# Altium footprint library PCB-Tester-Board-V1.PcbLib: 48 footprints (part 2 of 3)
Each footprint in its own frame and in the unit in brackets; x right, y up, seen from the top. Pads: shape width x height; smd on the part's side, far side on the other; paste and mask are expansions set on the pad; w line width, h text height; cw(c..) or ccw(c..) is an arc to the next point about the centre after c.
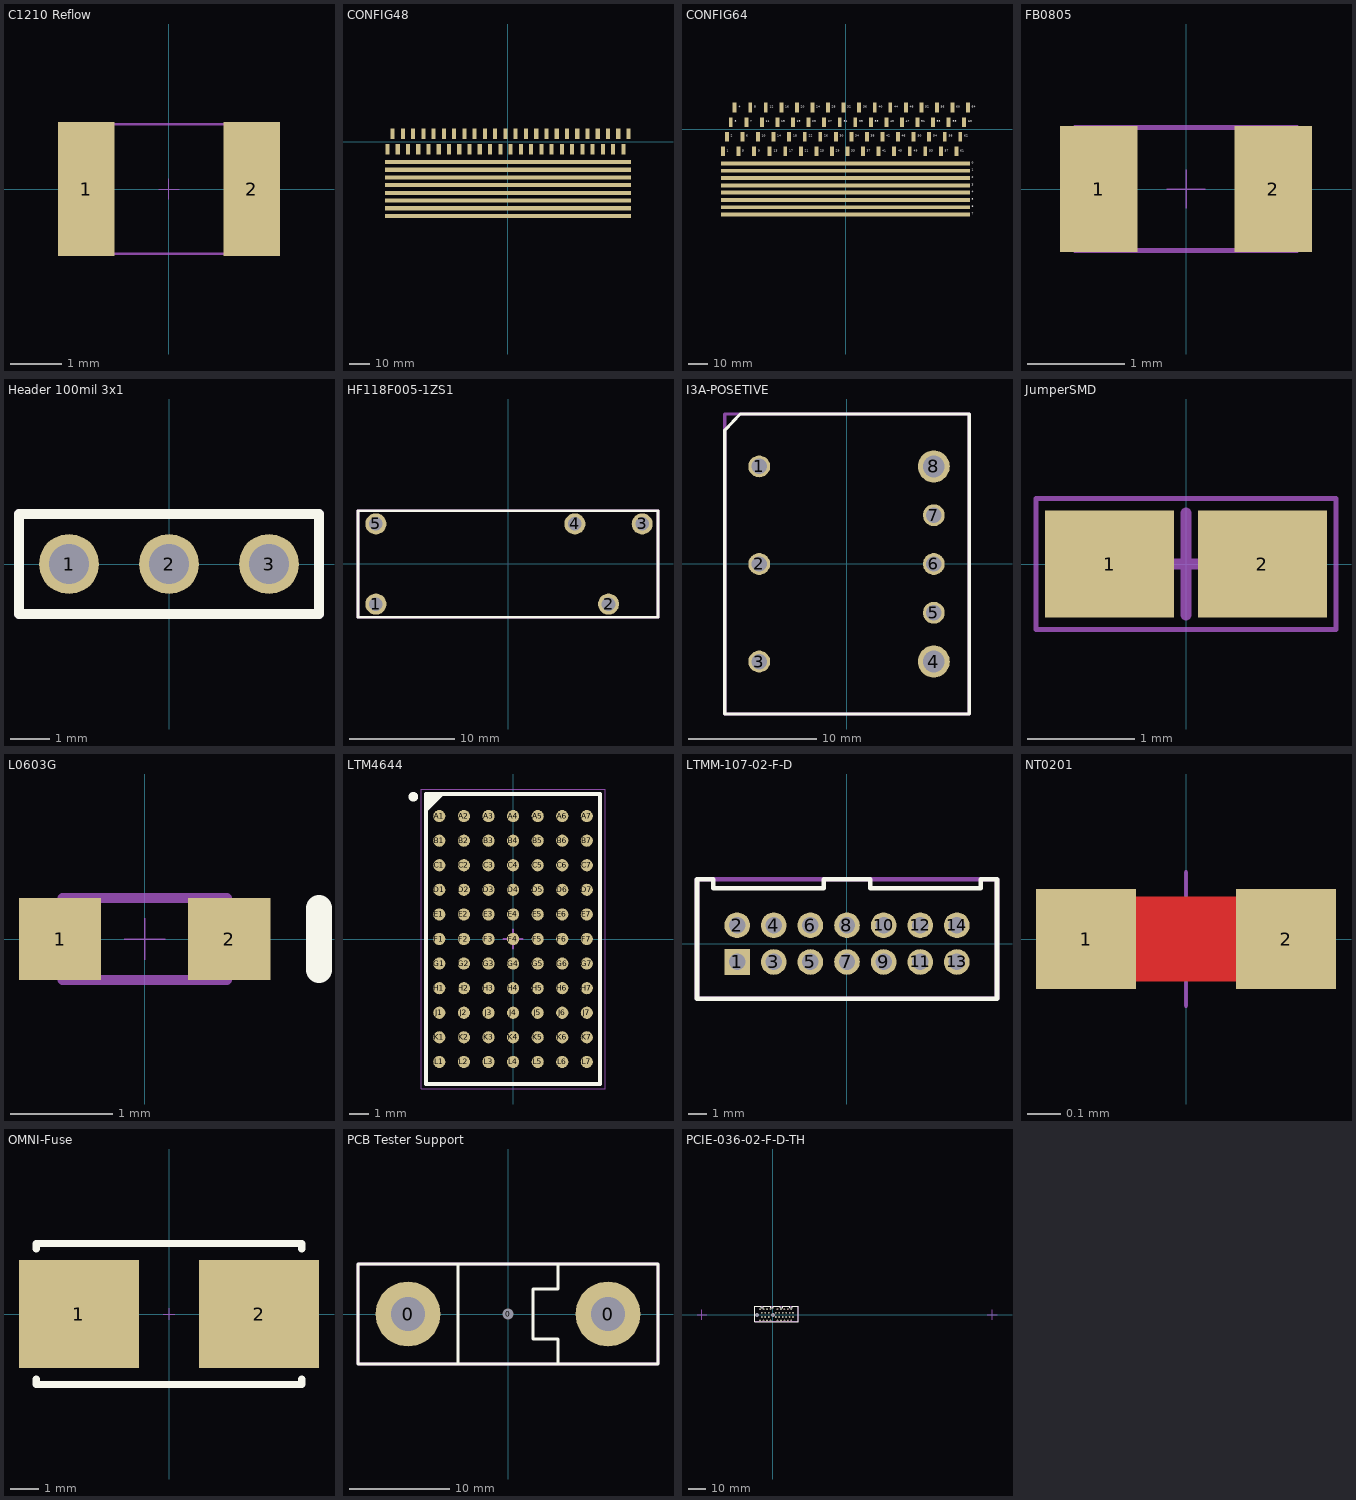
[diagram p1: the footprints below, top view; thin cyan lines are the x and y axes]

## C1210 Reflow [mm] "SMT Capacitor 1210 Reflow Soldering"
pads (2):
  rect 1.1x2.6 smd: 1(-1.6,0) 2(1.6,0)
Top Courtyard:
  lines w0.05: -1.6,-1.25 1.6,-1.25 1.6,1.25 -1.6,1.25 -1.6,-1.25
Mechanical 17:
  lines w0.013: -0.2,0 0.2,0 ; 0,-0.2 0,0.2
3D body "C1210.STEP": height 0.78, standoff 0, extent -1.6,-1.25 1.6,1.25

## CONFIG48 [mm] "PCB Tester Configuration area (48 relays)"
pads (56):
  rect 2x5 smd: 1(-58.75,-3.75) 2(-56.25,3.75) 3(-53.75,-3.75) 4(-51.25,3.75) 5(-48.75,-3.75) 6(-46.25,3.75) 7(-43.75,-3.75) 8(-41.25,3.75) 9(-38.75,-3.75) 10(-36.25,3.75) 11(-33.75,-3.75) 12(-31.25,3.75) 13(-28.75,-3.75) 14(-26.25,3.75) 15(-23.75,-3.75) 16(-21.25,3.75) 17(-18.75,-3.75) 18(-16.25,3.75) 19(-13.75,-3.75) 20(-11.25,3.75) 21(-8.75,-3.75) 22(-6.25,3.75) 23(-3.75,-3.75) 24(-1.25,3.75) 25(1.25,-3.75) 26(3.75,3.75) 27(6.25,-3.75) 28(8.75,3.75) 29(11.25,-3.75) 30(13.75,3.75) 31(16.25,-3.75) 32(18.75,3.75) 33(21.25,-3.75) 34(23.75,3.75) 35(26.25,-3.75) 36(28.75,3.75) 37(31.25,-3.75) 38(33.75,3.75) 39(36.25,-3.75) 40(38.75,3.75) 41(41.25,-3.75) 42(43.75,3.75) 43(46.25,-3.75) 44(48.75,3.75) 45(51.25,-3.75) 46(53.75,3.75) 47(56.25,-3.75) 48(58.75,3.75)
  rect 120x2 smd paste-100: ABUS0(0,-10) ABUS1(0,-13.75) ABUS2(0,-17.5) ABUS3(0,-21.25) ABUS4(0,-25) ABUS5(0,-28.75) ABUS6(0,-32.5) ABUS7(0,-36.25)

## CONFIG64 [mm] "PCB Tester Configuration area (64 relays)"
pads (72):
  rect 2x5 smd: 1(-63,-11.25) 2(-61,-3.75) 3(-59,3.75) 4(-57,11.25) 5(-55,-11.25) 6(-53,-3.75) 7(-51,3.75) 8(-49,11.25) 9(-47,-11.25) 10(-45,-3.75) 11(-43,3.75) 12(-41,11.25) 13(-39,-11.25) 14(-37,-3.75) 15(-35,3.75) 16(-33,11.25) 17(-31,-11.25) 18(-29,-3.75) 19(-27,3.75) 20(-25,11.25) 21(-23,-11.25) 22(-21,-3.75) 23(-19,3.75) 24(-17,11.25) 25(-15,-11.25) 26(-13,-3.75) 27(-11,3.75) 28(-9,11.25) 29(-7,-11.25) 30(-5,-3.75) 31(-3,3.75) 32(-1,11.25) 33(1,-11.25) 34(3,-3.75) 35(5,3.75) 36(7,11.25) 37(9,-11.25) 38(11,-3.75) 39(13,3.75) 40(15,11.25) 41(17,-11.25) 42(19,-3.75) 43(21,3.75) 44(23,11.25) 45(25,-11.25) 46(27,-3.75) 47(29,3.75) 48(31,11.25) 49(33,-11.25) 50(35,-3.75) 51(37,3.75) 52(39,11.25) 53(41,-11.25) 54(43,-3.75) 55(45,3.75) 56(47,11.25) 57(49,-11.25) 58(51,-3.75) 59(53,3.75) 60(55,11.25) 61(57,-11.25) 62(59,-3.75) 63(61,3.75) 64(63,11.25)
  rect 128x2 smd paste-100: ABUS0(0,-17.5) ABUS1(0,-21.25) ABUS2(0,-25) ABUS3(0,-28.75) ABUS4(0,-32.5) ABUS5(0,-36.25) ABUS6(0,-40) ABUS7(0,-43.75)
Top Overlay:
  text "4" at -55,10.616 h2
  text "3" at -57,3.125 h2
  text "2" at -59,-4.381 h2
  text "1" at -61.005,-11.882 h2
  text "0" at 65,-18.124 h2
  text "1" at 65,-21.884 h2
  text "2" at 65,-25.608 h2
  text "3" at 65,-29.367 h2
  text "4" at 65,-33.11 h2
  text "5" at 65,-36.887 h2
  text "6" at 65,-40.647 h2
  text "7" at 65,-44.371 h2
  text "5" at -53.004,-11.883 h2
  text "6" at -51,-4.382 h2
  text "7" at -49,3.125 h2
  text "8" at -47,10.616 h2
  text "9" at -45.004,-11.883 h2
  text "10" at -43,-4.382 h2
  text "11" at -41,3.125 h2
  text "12" at -39,10.616 h2
  text "13" at -37.004,-11.883 h2
  text "14" at -35,-4.382 h2
  text "15" at -33,3.125 h2
  text "16" at -31,10.616 h2
  text "17" at -29.004,-11.883 h2
  text "18" at -27,-4.382 h2
  text "19" at -25,3.125 h2
  text "20" at -23,10.616 h2
  text "21" at -21.004,-11.883 h2
  text "22" at -19,-4.382 h2
  text "23" at -17,3.125 h2
  text "24" at -15,10.616 h2
  text "25" at -13.004,-11.883 h2
  text "26" at -11,-4.382 h2
  text "27" at -9,3.125 h2
  text "28" at -7,10.616 h2
  text "29" at -5.004,-11.883 h2
  text "30" at -3,-4.382 h2
  text "31" at -1,3.125 h2
  text "32" at 1,10.616 h2
  text "33" at 2.996,-11.883 h2
  text "34" at 5,-4.382 h2
  text "35" at 7,3.125 h2
  text "36" at 9,10.616 h2
  text "37" at 10.996,-11.883 h2
  text "38" at 13,-4.382 h2
  text "39" at 15,3.125 h2
  text "40" at 17,10.616 h2
  text "41" at 18.996,-11.883 h2
  text "42" at 21,-4.382 h2
  text "43" at 23,3.125 h2
  text "44" at 25,10.616 h2
  text "45" at 26.996,-11.883 h2
  text "46" at 29,-4.382 h2
  text "47" at 31,3.125 h2
  text "48" at 33,10.616 h2
  text "49" at 34.996,-11.883 h2
  text "50" at 37,-4.382 h2
  text "51" at 39,3.125 h2
  text "52" at 41,10.616 h2
  text "53" at 42.996,-11.883 h2
  text "54" at 45,-4.382 h2
  text "55" at 47,3.125 h2
  text "56" at 49,10.616 h2
  text "57" at 50.996,-11.883 h2
  text "58" at 53,-4.382 h2
  text "59" at 55,3.125 h2
  text "60" at 57,10.616 h2
  text "61" at 58.996,-11.883 h2
  text "62" at 61,-4.382 h2
  text "63" at 63,3.125 h2
  text "64" at 65,10.616 h2

## FB0805 [mm] "SMT Ferrite Bead 0805"
pads (2):
  rect 0.8x1.3 smd: 1(-0.9,0) 2(0.9,0)
Top Courtyard:
  lines w0.05: -1.15,-0.635 -1.15,0.635 1.15,0.635 1.15,-0.635 -1.15,-0.635
Mechanical 17:
  lines w0.013: -0.2,0 0.2,0 ; 0,-0.2 0,0.2
3D body "MPZ2012.STEP": height 1.05, standoff 0, extent -1.15,-0.635 1.15,0.635

## Header 100mil 3x1 [mil] "HMTSW-103-07-G-S-240"
pads (3):
  round 60 hole 40: 1(-100,0) 2(0,0) 3(100,0)
Top Overlay:
  lines w10: -150,-50 150,-50 150,50 -150,50 -150,-50
  text "." at -102.76,-70.87 h39.37
Top Courtyard:
  lines w10: -150,-50 150,-50 150,50 -150,50 -150,-50
3D body "HMTSW-103-07-G-S-240.STEP": height 340, standoff -90, extent -149.99,-48.99 150.01,49

## HF118F005-1ZS1 [mm] "Power Relay (Switch Over)"
pads (5):
  round 2 hole 1.3 unplated paste-5: 1(-12.55,-3.81) 2(9.55,-3.81) 3(12.75,3.81) 4(6.35,3.81) 5(-12.55,3.81)
Top Overlay:
  lines w0.254: -14.25,-5.05 -14.25,5.05 14.25,5.05 14.25,-5.05 -14.25,-5.05
Top Courtyard:
  lines w0.254: -14.25,-5.05 -14.25,5.05 14.25,5.05 14.25,-5.05 -14.25,-5.05
3D body "HF118F005-1ZS1.STEP": height 12.2, standoff -3.7, extent -14.25,-5.05 14.25,5.05

## HSM2.5-6.4-16-2 [mm] "M2.5 x 16 mm hex standoff"
3D body "HSM2.5-6.4-16-2.STEP": height 16, standoff -6, extent -3.695,-3.2 3.695,3.2

## I3A-POSETIVE [mm]
pads (8):
  round 1.7 hole 1.2 paste+0: 1(-6.8,7.6) 2(-6.8,0) 3(-6.8,-7.6) 5(6.8,-3.8) 6(6.8,0) 7(6.8,3.8)
  round 2.5 hole 1.7 paste+0: 4(6.8,-7.6) 8(6.8,7.6)
Top Overlay:
  lines w0.254: -9.487,-11.684 9.563,-11.684 9.563,11.684 -8.293,11.684 -9.487,10.414 -9.487,-11.684
Top Courtyard:
  lines w0.254: 9.563,-11.684 -9.487,-11.684 -9.487,11.684 9.563,11.684 9.563,-11.684 ; 9.563,-11.684 9.563,-11.684
3D body "i3a.STEP": height 9.54, standoff -3.68, extent -9.487,-11.684 9.563,11.684

## JumperSMD [mm] "Chip Resistor, Body 1.6x0.8mm (LxW typ), IPC High Density"
height 10
pads (2):
  rect 1.2x1 smd: 1(-0.711,0) 2(0.711,0)
Top Courtyard:
  lines w0.05: -1.397,-0.61 1.397,-0.61 1.397,0.61 -1.397,0.61 -1.397,-0.61
Mechanical 17:
  lines w0.1: -0.475,0 0.475,0 ; 0,-0.475 0,0.475 0,-0.475
3D body "R0603.STEP": height 0.45, standoff 0, extent -0.889,-0.4 0.711,0.4

## L0603G [mm] "LTST-C191KGKT"
pads (2):
  rect 0.8x0.8 smd: 1(-0.825,0) 2(0.825,0)
Top Overlay:
  lines w0.254: 1.7,-0.3 1.7,0.3
Top Courtyard:
  lines w0.1: -0.8,-0.4 0.8,-0.4 0.8,0.4 -0.8,0.4 -0.8,-0.4
Mechanical 17:
  lines w0.013: -0.2,0 0.2,0 ; 0,-0.2 0,0.2
3D body "L0603G.STEP": height 0.8, standoff 0, extent -0.8,-0.4 0.8,0.4

## LTM4644 [mm]
height 5.21
pads (77):
  round 0.63 smd: A1(-3.81,6.35) A2(-2.54,6.35) A3(-1.27,6.35) A4(0,6.35) A5(1.27,6.35) A6(2.54,6.35) A7(3.81,6.35) B1(-3.81,5.08) B2(-2.54,5.08) B3(-1.27,5.08) B4(0,5.08) B5(1.27,5.08) B6(2.54,5.08) B7(3.81,5.08) C1(-3.81,3.81) C2(-2.54,3.81) C3(-1.27,3.81) C4(0,3.81) C5(1.27,3.81) C6(2.54,3.81) C7(3.81,3.81) D1(-3.81,2.54) D2(-2.54,2.54) D3(-1.27,2.54) D4(0,2.54) D5(1.27,2.54) D6(2.54,2.54) D7(3.81,2.54) E1(-3.81,1.27) E2(-2.54,1.27) E3(-1.27,1.27) E4(0,1.27) E5(1.27,1.27) E6(2.54,1.27) E7(3.81,1.27) F1(-3.81,0) F2(-2.54,0) F3(-1.27,0) F4(0,0) F5(1.27,0) F6(2.54,0) F7(3.81,0) G1(-3.81,-1.27) G2(-2.54,-1.27) G3(-1.27,-1.27) G4(0,-1.27) G5(1.27,-1.27) G6(2.54,-1.27) G7(3.81,-1.27) H1(-3.81,-2.54) H2(-2.54,-2.54) H3(-1.27,-2.54) H4(0,-2.54) H5(1.27,-2.54) H6(2.54,-2.54) H7(3.81,-2.54) J1(-3.81,-3.81) J2(-2.54,-3.81) J3(-1.27,-3.81) J4(0,-3.81) J5(1.27,-3.81) J6(2.54,-3.81) J7(3.81,-3.81) K1(-3.81,-5.08) K2(-2.54,-5.08) K3(-1.27,-5.08) K4(0,-5.08) K5(1.27,-5.08) K6(2.54,-5.08) K7(3.81,-5.08) L1(-3.81,-6.35) L2(-2.54,-6.35) L3(-1.27,-6.35) L4(0,-6.35) L5(1.27,-6.35) L6(2.54,-6.35) L7(3.81,-6.35)
Top Overlay:
  circle w0.25: c-5.15,7.35 r0.125
  region: -3.671,7.5 -4.5,6.671 -4.5,7.5
  lines w0.2: -4.5,6.671 -3.671,7.5 ; -4.5,-7.5 -4.5,7.5 4.5,7.5 4.5,-7.5 -4.5,-7.5
Top Component Outline:
  lines w0.1: -4.5,-7.5 4.5,-7.5 4.5,7.5 -4.5,7.5 -4.5,-7.5
Top Courtyard:
  lines w0.05: -4.75,-7.75 -4.75,7.75 4.75,7.75 4.75,-7.75 -4.75,-7.75
Mechanical 17:
  lines w0.1: -0.5,0 0.5,0 ; 0,-0.5 0,0.5
3D body "LTM4644.STEP": height 5.11, standoff 0, extent -4.5,-7.5 4.5,7.5

## LTMM-107-02-F-D [mm] "CONN HEADER VERT 14POS 2MM (Xilinx JTAG)"
pads (14):
  rect 1.4x1.4 hole 0.9 paste+0: 1(-6,-1)
  round 1.4 hole 0.9 paste+0: 2(-6,1) 3(-4,-1) 4(-4,1) 5(-2,-1) 6(-2,1) 7(0,-1) 8(0,1) 9(2,-1) 10(2,1) 11(4,-1) 12(4,1) 13(6,-1) 14(6,1)
Top Overlay:
  lines w0.254: -8.191,-3.015 8.191,-3.015 8.191,3.523 7.3,3.523 7.3,3.023 1.27,3.023 1.27,3.523 -1.27,3.523 -1.27,3.023 -7.3,3.023 -7.3,3.523 -8.191,3.523 -8.191,-3.015
Top Courtyard:
  lines w0.254: -8.191,-3.015 8.191,-3.015 8.191,3.523 -8.191,3.523 -8.191,-3.015
3D body "LTMM-107-02-F-D.STEP": height 4.83, standoff -2.97, extent -8.191,-3.015 8.191,3.523

## NT0201 [mm] "10 mil"
pads (2):
  rect 0.3x0.3 smd paste-1: 1(-0.3,0) 2(0.3,0)
Top Layer:
  lines w0.254: -0.3,0 0.3,0
Mechanical 17:
  lines w0.013: -0.2,0 0.2,0 ; 0,-0.2 0,0.2

## OMNI-Fuse [mm] "SMD2 Fuse Clip"
pads (2):
  rect 4.24x3.81 smd: 1(-3.19,0) 2(3.19,0)
Top Overlay:
  lines w0.254: -4.7,-2.3 -4.7,-2.5 4.7,-2.5 4.7,-2.3 ; -4.7,2.3 -4.7,2.5 4.7,2.5 4.7,2.3
Mechanical 17:
  lines w0.013: -0.2,0 0.2,0 ; 0,-0.2 0,0.2
3D body "OMNI-block.STEP": height 3.81, standoff 0, extent -4.915,-2.515 4.915,2.515

## PCB Tester Support [mm]
pads (3):
  round 6.5 hole 3.4 unplated paste-1: 0(-10,0) 0(10,0)
  round 1 hole 1.1 unplated paste-1: 0(0,0)
Top Overlay:
  lines w0.254: -5,-5 -5,5 ; 5,-5 5,-2.5 2.5,-2.5 2.5,2.5 5,2.5 5,5 ; -15,-5 15,-5 15,5 -15,5 -15,-5
Top Courtyard:
  lines w0.254: -15,-5 15,-5 15,5 -15,5 -15,-5
3D body "SupportPost.STEP": height 133, standoff 0, extent -15,-5 15,5

## PCIE-036-02-F-D-TH [mm] "CONN PCI EXP FMALE 36POS 0.039"
pads (38):
  round 1 hole 2.35 unplated paste-2: 0(-9.15,0) 0(0,0)
  round 1 hole 0.7 paste-2: A1(11.65,-1.25) A2(10.65,-3.25) A3(9.65,-1.25) A4(8.65,-3.25) A5(7.65,-1.25) A6(6.65,-3.25) A7(5.65,-1.25) A8(4.65,-3.25) A9(3.65,-1.25) A10(2.65,-3.25) A11(1.65,-1.25) A12(-1.35,-3.25) A13(-2.35,-1.25) A14(-3.35,-3.25) A15(-4.35,-1.25) A16(-5.35,-3.25) A17(-6.35,-1.25) A18(-7.35,-3.25) B1(11.65,1.25) B2(10.65,3.25) B3(9.65,1.25) B4(8.65,3.25) B5(7.65,1.25) B6(6.65,3.25) B7(5.65,1.25) B8(4.65,3.25) B9(3.65,1.25) B10(2.65,3.25) B11(1.65,1.25) B12(-1.35,3.25) B13(-2.35,1.25) B14(-3.35,3.25) B15(-4.35,1.25) B16(-5.35,3.25) B17(-6.35,1.25) B18(-7.35,3.25)
Top Overlay:
  lines w0.254: -10.359,-4.1 -10.359,5.05 -6.809,5.05 -6.809,4.1 -5.409,4.1 -5.409,5.05 -1.309,5.05 -1.309,4.1 0.091,4.1 0.091,5.05 4.191,5.05 4.191,4.1 5.591,4.1 5.591,5.05 9.691,5.05 9.691,4.1 11.091,4.1 11.091,5.05 14.641,5.05 14.641,-4.1 -10.359,-4.1
Top Courtyard:
  lines w0.254: -10.359,-3.65 -10.359,5.05 14.641,5.05 14.641,-3.65 -10.359,-3.65
Mechanical 17:
  lines w0.254: -43.662,0 -37.978,0 ; -40.822,-2.845 -40.822,2.845 ; 123.338,0 129.022,0 ; 126.178,-2.845 126.178,2.845
3D body "PCIE-036-02-F-D-TH.STEP": height 11.01, standoff -4.39, extent -10.359,-3.65 14.641,5.05